# Altium schematic symbol library FPGA_Xilinx_Virtex7.SchLib: 34 symbols (part 6 of 34) (continued)
## XC7VH580T-FLG1931 (continued)
part P pins: A8 MGTZAGND_300 (power), A11 MGTZAGND_300 (power), A14 MGTZAGND_300 (power), A15 MGTZAGND_300 (power), A18 MGTZAGND_300 (power), A21 MGTZAGND_300 (power), A22 MGTZAGND_300 (power), A23 MGTZAGND_300 (power), A26 MGTZAGND_300 (power), A29 MGTZAGND_300 (power), A30 MGTZAGND_300 (power), A33 MGTZAGND_300 (power), A36 MGTZAGND_300 (power), A37 MGTZAGND_300 (power), B8 MGTZAGND_300 (power), B9 MGTZAVCC_300 (power), B10 MGTZAGND_300 (power), B11 MGTZAVCC_300 (power), B12 MGTZAGND_300 (power), B13 MGTZAVCC_300 (power), B14 MGTZAGND_300 (power), B15 MGTZAVCC_300 (power), B16 MGTZAGND_300 (power), B17 MGTZAVCC_300 (power), B18 MGTZAGND_300 (power), B19 MGTZAVCC_300 (power), B20 MGTZAGND_300 (power), B21 MGTZAVCC_300 (power), B22 MGTZAGND_300 (power), B23 MGTZAVCC_300 (power), B24 MGTZAGND_300 (power), B25 MGTZAVCC_300 (power), B26 MGTZAGND_300 (power), B27 MGTZAVCC_300 (power), B28 MGTZAGND_300 (power), B29 MGTZAVCC_300 (power), B30 MGTZAGND_300 (power), B31 MGTZAVCC_300 (power), B32 MGTZAGND_300 (power), B33 MGTZAVCC_300 (power), B34 MGTZAGND_300 (power), B35 MGTZAVCC_300 (power), B36 MGTZAGND_300 (power), B37 MGTZAVCC_300 (power), C8 MGTZAGND_300 (power), C9 MGTZAGND_300 (power), C12 MGTZAGND_300 (power), C15 MGTZAGND_300 (power), C16 MGTZAGND_300 (power), C19 MGTZAGND_300 (power), C22 MGTZAGND_300 (power), C23 MGTZAGND_300 (power), C24 MGTZAGND_300 (power), C27 MGTZAGND_300 (power), C30 MGTZAGND_300 (power), C31 MGTZAGND_300 (power), C34 MGTZAGND_300 (power), C37 MGTZAGND_300 (power), D8 MGTZAGND_300 (power), D9 MGTZAGND_300 (power), D10 MGTZAGND_300 (power), D11 MGTZAGND_300 (power), D12 MGTZAGND_300 (power), D13 MGTZAGND_300 (power), D14 MGTZAGND_300 (power), D15 MGTZAGND_300 (power), D16 MGTZAGND_300 (power), D17 MGTZAGND_300 (power), D18 MGTZAGND_300 (power), D19 MGTZAGND_300 (power), D20 MGTZAGND_300 (power), D21 MGTZAGND_300 (power), D22 MGTZAGND_300 (power), D23 MGTZAGND_300 (power), D24 MGTZAGND_300 (power), D25 MGTZAGND_300 (power), D26 MGTZAGND_300 (power), D27 MGTZAGND_300 (power), D28 MGTZAGND_300 (power), D29 MGTZAGND_300 (power), D30 MGTZAGND_300 (power), D31 MGTZAGND_300 (power), D32 MGTZAGND_300 (power), D33 MGTZAGND_300 (power), D34 MGTZAGND_300 (power), D35 MGTZAGND_300 (power), D36 MGTZAGND_300 (power), D37 MGTZAGND_300 (power), E18 MGTZ_SENSE_AVCC_300 (power), F18 MGTZ_SENSE_AGND_300 (power), F20 MGTZVCCH_300 (power), F22 MGTZVCCH_300 (power), F24 MGTZVCCH_300 (power), F26 MGTZVCCH_300 (power), G18 MGTZVCCH_300 (power), G26 MGTZ_SENSE_GND_300 (power), G27 MGTZ_SENSE_VCCH_300 (power), H26 MGTZ_SENSE_VCC_300 (power), J19 MGTZVCCH_300 (power), J21 MGTZVCCH_300 (power), J23 MGTZVCCH_300 (power), J25 MGTZVCCH_300 (power), J27 MGTZVCCH_300 (power), K19 MGTZ_SENSE_VCCL_300 (power), K20 MGTZ_SENSE_GNDL_300 (power), L20 MGTZVCCL_300 (power), L22 MGTZVCCL_300 (power), L24 MGTZVCCL_300 (power), L26 MGTZVCCL_300 (power)
part Q pins: AB22 VREFN_0 (io), AB23 VP_0 (io), AC22 VN_0 (io), AC23 VREFP_0 (io), AD22 DXN_0 (io), AD23 DXP_0 (io), L18 TCK_0 (io), M17 INIT_B_0 (io), M19 CCLK_0 (io), M21 TDI_0 (io), M23 M2_0 (io), M25 M0_0 (io), N26 TDO_0 (io), P23 PROGRAM_B_0 (io), P27 TMS_0 (io), T19 M1_0 (io), T27 DONE_0 (io), V17 VCCO_0 (power), W16 VCCO_0 (power)
part R pins: A3 GND (power), A4 GND (power), A7 GND (power), A38 GND (power), A41 GND (power), A42 GND (power), AA15 VCCINT (power), AA17 VCCINT (power), AA19 VCCAUX_IO_G3 (power), AA21 VCCINT (power), AA22 GNDADC (power), AA23 VCCADC (power), AA25 VCCAUX_IO_G1 (power), AA27 VCCINT (power), AA29 VCCINT (power), AA31 VCCINT (power), AB16 VCCINT (power), AB18 VCCAUX (power), AB20 VCCINT (power), AB24 VCCBRAM (power), AB26 VCCAUX (power), AB28 VCCINT (power), AB30 VCCINT (power), AC15 VCCINT (power), AC17 VCCINT (power), AC19 VCCAUX_IO_G3 (power), AC21 VCCINT (power), AC25 VCCAUX_IO_G1 (power), AC27 VCCINT (power), AC29 VCCINT (power), AD14 VCCINT (power), AD16 VCCINT (power), AD18 VCCAUX (power), AD20 VCCINT (power), AD24 VCCBRAM (power), AD26 VCCAUX (power), AD28 VCCINT (power), AD30 VCCINT (power), AE15 VCCINT (power), AE17 VCCINT (power), AE19 VCCAUX_IO_G2 (power), AE21 VCCINT (power), AE23 VCCINT (power), AE25 VCCAUX_IO_G1 (power), AE27 VCCINT (power), AE29 VCCINT (power), AE31 VCCINT (power), AF14 VCCINT (power), AF16 VCCINT (power), AF18 VCCAUX (power), AF20 VCCINT (power), AF22 VCCINT (power), AF24 VCCBRAM (power), AF26 VCCAUX (power), AF28 VCCINT (power), AF30 VCCINT (power), AG15 VCCINT (power), AG17 VCCINT (power), AG19 VCCAUX_IO_G2 (power), AG21 VCCINT (power), AG23 VCCINT (power), AG25 VCCAUX_IO_G0 (power), AG27 VCCINT (power), AG29 VCCINT (power), AH18 VCCAUX (power), AH20 VCCINT (power), AH22 VCCINT (power), AH24 VCCBRAM (power), AH26 VCCAUX (power), AH28 VCCINT (power), AJ17 VCCINT (power), AJ19 VCCAUX_IO_G2 (power), AJ21 VCCINT (power), AJ23 VCCINT (power), AJ25 VCCAUX_IO_G0 (power), AJ27 VCCINT (power), AJ29 VCCINT (power), AK18 VCCAUX (power), AK20 VCCINT (power), AK22 VCCINT (power), AK24 VCCBRAM (power), AK26 VCCAUX (power), AL19 VCCAUX_IO_G2 (power), AL21 VCCINT (power), AL23 VCCINT (power), AL25 VCCAUX_IO_G0 (power), AM20 VCCINT (power), AM22 VCCINT (power), AM24 VCCBRAM (power), AM26 VCCAUX (power), B2 GND (power), B6 GND (power), B7 GND (power), B38 GND (power), B39 GND (power), B43 GND (power), C4 GND (power), C7 GND (power), C38 GND (power), C41 GND (power), D1 GND (power), D5 GND (power), D6 GND (power), D7 GND (power), D38 GND (power), D39 GND (power), D40 GND (power), D44 GND (power), E3 GND (power), E7 GND (power), E8 GND (power), E9 GND (power), E10 GND (power), E11 GND (power), E12 GND (power), E13 GND (power), E14 GND (power), E15 GND (power), E16 GND (power), E17 GND (power), E19 GND (power), E22 GND (power), E23 GND (power), E26 GND (power), E27 GND (power), E28 GND (power), E29 GND (power), E30 GND (power), E31 GND (power), E32 GND (power), E33 GND (power), E34 GND (power), E35 GND (power), E36 GND (power), E37 GND (power), E38 GND (power), E42 GND (power), F1 GND (power), F5 GND (power), F6 GND (power), F7 GND (power), F17 GND (power), F19 GND (power), F21 GND (power), F23 GND (power), F25 GND (power), F27 GND (power), F28 GND (power), F37 GND (power), F38 GND (power), F39 GND (power), F40 GND (power), F44 GND (power), G3 GND (power), G4 GND (power), G7 GND (power), G14 GND (power), G17 GND (power), G19 GND (power), G22 GND (power), G23 GND (power), G24 GND (power), G25 GND (power), G28 GND (power), G34 GND (power), G38 GND (power), G41 GND (power), G42 GND (power), H1 GND (power), H2 GND (power), H6 GND (power), H7 GND (power), H11 GND (power), H17 GND (power), H18 GND (power), H19 GND (power), H20 GND (power), H21 GND (power), H23 GND (power), H24 GND (power), H25 GND (power), H27 GND (power), H28 GND (power), H31 GND (power), M27 VCCBATT_0 (power), N17 VCCINT (power), N19 VCCINT (power), N21 VCCINT (power), N23 VCCINT (power), N25 VCCINT (power), N27 VCCINT (power), P18 VCCINT (power), P20 VCCINT (power), P22 VCCINT (power), P24 VCCINT (power), P26 VCCINT (power), P28 VCCINT (power), R17 VCCINT (power), R19 VCCINT (power), R21 VCCINT (power), R23 VCCINT (power), R25 VCCINT (power), R27 VCCINT (power), T18 VCCINT (power), T20 VCCINT (power), T22 VCCINT (power), T24 VCCINT (power), T26 VCCINT (power), T28 VCCINT (power), U17 VCCINT (power), U19 VCCINT (power), U21 VCCINT (power), U23 VCCBRAM (power), U25 VCCINT (power), U27 VCCINT (power), V16 VCCINT (power), V18 VCCINT (power), V20 VCCINT (power), V22 VCCINT (power), V24 VCCBRAM (power), V26 VCCINT (power), V28 VCCINT (power), V30 VCCINT (power), W15 VCCINT (power), W17 VCCINT (power), W19 VCCAUX_IO_G3 (power), W21 VCCINT (power), W23 VCCBRAM (power), W25 VCCINT (power), W27 VCCINT (power), W29 VCCINT (power), W31 VCCINT (power), Y14 VCCINT (power), Y16 VCCINT (power), Y18 VCCAUX (power), Y20 VCCINT (power), Y22 VCCINT (power), Y24 VCCBRAM (power), Y26 VCCINT (power), Y28 VCCINT (power), Y30 VCCINT (power)
part S pins: AA4 GND (power), AA7 GND (power), AA12 GND (power), AA14 GND (power), AA16 GND (power), AA18 GND (power), AA20 GND (power), AA24 GND (power), AA26 GND (power), AA28 GND (power), AA30 GND (power), AA32 GND (power), AA38 GND (power), AA41 GND (power), AB1 GND (power), AB5 GND (power), AB7 GND (power), AB9 GND (power), AB15 GND (power), AB17 GND (power), AB19 GND (power), AB21 GND (power), AB25 GND (power), AB27 GND (power), AB29 GND (power), AB31 GND (power), AB38 GND (power), AB40 GND (power), AB44 GND (power), AC3 GND (power), AC7 GND (power), AC14 GND (power), AC16 GND (power), AC18 GND (power), AC20 GND (power), AC24 GND (power), AC26 GND (power), AC28 GND (power), AC30 GND (power), AC36 GND (power), AC38 GND (power), AC42 GND (power), AD1 GND (power), AD5 GND (power), AD7 GND (power), AD13 GND (power), AD15 GND (power), AD17 GND (power), AD19 GND (power), AD21 GND (power), AD25 GND (power), AD27 GND (power), AD29 GND (power), AD31 GND (power), AD33 GND (power), AD38 GND (power), AD40 GND (power), AD44 GND (power), AE3 GND (power), AE4 GND (power), AE7 GND (power), AE10 GND (power), AE14 GND (power), AE16 GND (power), AE18 GND (power), AE20 GND (power), AE22 GND (power), AE24 GND (power), AE26 GND (power), AE28 GND (power), AE30 GND (power), AE38 GND (power), AE41 GND (power), AE42 GND (power), AF1 GND (power), AF6 GND (power), AF7 GND (power), AF15 GND (power), AF17 GND (power), AF19 GND (power), AF21 GND (power), AF23 GND (power), AF25 GND (power), AF27 GND (power), AF29 GND (power), AF31 GND (power), AF37 GND (power), AF38 GND (power), AF39 GND (power), AF44 GND (power), AG4 GND (power), AG7 GND (power), AG14 GND (power), AG16 GND (power), AG18 GND (power), AG20 GND (power), AG22 GND (power), AG24 GND (power), AG26 GND (power), AG28 GND (power), AG30 GND (power), AG34 GND (power), AG38 GND (power), AG41 GND (power), AH1 GND (power), AH2 GND (power), AH5 GND (power), AH6 GND (power), AH7 GND (power), AH11 GND (power), AH17 GND (power), AH19 GND (power), AH21 GND (power), AH23 GND (power), AH25 GND (power), AH27 GND (power), AH29 GND (power), AH31 GND (power), H38 GND (power), H39 GND (power), H43 GND (power), H44 GND (power), J3 GND (power), J4 GND (power), J7 GND (power), J8 GND (power), J17 GND (power), J18 GND (power), J20 GND (power), J24 GND (power), J26 GND (power), J28 GND (power), J38 GND (power), J41 GND (power), J42 GND (power), K1 GND (power), K5 GND (power), K6 GND (power), K7 GND (power), K15 GND (power), K17 GND (power), K18 GND (power), K21 GND (power), K22 GND (power), K23 GND (power), K24 GND (power), K25 GND (power), K26 GND (power), K27 GND (power), K28 GND (power), K35 GND (power), K38 GND (power), K39 GND (power), K40 GND (power), K44 GND (power), L3 GND (power), L7 GND (power), L12 GND (power), L17 GND (power), L19 GND (power), L21 GND (power), L23 GND (power), L25 GND (power), L27 GND (power), L28 GND (power), L32 GND (power), L38 GND (power), L42 GND (power), M1 GND (power), M2 GND (power), M5 GND (power), M6 GND (power), M7 GND (power), M9 GND (power), M18 GND (power), M20 GND (power), M22 GND (power), M24 GND (power), M26 GND (power), M28 GND (power), M29 GND (power), M38 GND (power), M39 GND (power), M40 GND (power), M43 GND (power), M44 GND (power), N3 GND (power), N4 GND (power), N7 GND (power), N16 GND (power), N18 GND (power), N20 GND (power), N22 GND (power), N24 GND (power), N28 GND (power), N36 GND (power), N38 GND (power), N41 GND (power), N42 GND (power), P1 GND (power), P6 GND (power), P7 GND (power), P13 GND (power), P17 GND (power), P19 GND (power), P21 GND (power), P25 GND (power), P33 GND (power), P38 GND (power), P39 GND (power), P44 GND (power), R3 GND (power), R4 GND (power), R7 GND (power), R10 GND (power), R18 GND (power), R20 GND (power), R22 GND (power), R24 GND (power), R26 GND (power), R28 GND (power), R30 GND (power), R38 GND (power), R41 GND (power), R42 GND (power), T1 GND (power), T2 GND (power), T5 GND (power), T6 GND (power), T7 GND (power), T17 GND (power), T21 GND (power), T23 GND (power), T25 GND (power), T37 GND (power), T38 GND (power), T39 GND (power), T40 GND (power), T43 GND (power), T44 GND (power), U3 GND (power), U7 GND (power), U14 GND (power), U16 GND (power), U18 GND (power), U20 GND (power), U22 GND (power), U24 GND (power), U26 GND (power), U28 GND (power), U34 GND (power), U38 GND (power), U42 GND (power), V1 GND (power), V5 GND (power), V6 GND (power), V7 GND (power), V11 GND (power), V15 GND (power), V19 GND (power), V21 GND (power), V23 GND (power), V25 GND (power), V27 GND (power), V29 GND (power), V31 GND (power), V38 GND (power), V39 GND (power), V40 GND (power), V44 GND (power), W3 GND (power), W4 GND (power), W7 GND (power), W8 GND (power), W18 GND (power), W20 GND (power), W22 GND (power), W24 GND (power), W26 GND (power), W28 GND (power), W30 GND (power), W38 GND (power), W41 GND (power), W42 GND (power), Y1 GND (power), Y2 GND (power), Y6 GND (power), Y7 GND (power), Y15 GND (power), Y17 GND (power), Y19 GND (power), Y21 GND (power), Y23 GND (power), Y25 GND (power), Y27 GND (power), Y29 GND (power), Y31 GND (power), Y35 GND (power), Y38 GND (power), Y39 GND (power), Y43 GND (power), Y44 GND (power)
part T pins: AH38 GND (power), AH39 GND (power), AH40 GND (power), AH43 GND (power), AH44 GND (power), AJ3 GND (power), AJ7 GND (power), AJ8 GND (power), AJ18 GND (power), AJ20 GND (power), AJ22 GND (power), AJ24 GND (power), AJ26 GND (power), AJ28 GND (power), AJ38 GND (power), AJ42 GND (power), AK1 GND (power), AK5 GND (power), AK6 GND (power), AK7 GND (power), AK15 GND (power), AK19 GND (power), AK21 GND (power), AK23 GND (power), AK25 GND (power), AK35 GND (power), AK38 GND (power), AK39 GND (power), AK40 GND (power), AK44 GND (power), AL3 GND (power), AL4 GND (power), AL7 GND (power), AL12 GND (power), AL20 GND (power), AL22 GND (power), AL24 GND (power), AL26 GND (power), AL32 GND (power), AL38 GND (power), AL41 GND (power), AL42 GND (power), AM1 GND (power), AM2 GND (power), AM6 GND (power), AM7 GND (power), AM9 GND (power), AM19 GND (power), AM21 GND (power), AM23 GND (power), AM25 GND (power), AM29 GND (power), AM38 GND (power), AM39 GND (power), AM43 GND (power), AM44 GND (power), AN3 GND (power), AN4 GND (power), AN7 GND (power), AN16 GND (power), AN26 GND (power), AN36 GND (power), AN38 GND (power), AN41 GND (power), AN42 GND (power), AP1 GND (power), AP5 GND (power), AP6 GND (power), AP7 GND (power), AP13 GND (power), AP23 GND (power), AP33 GND (power), AP38 GND (power), AP39 GND (power), AP40 GND (power), AP44 GND (power), AR3 GND (power), AR7 GND (power), AR10 GND (power), AR20 GND (power), AR30 GND (power), AR38 GND (power), AR42 GND (power), AT1 GND (power), AT2 GND (power), AT5 GND (power), AT6 GND (power), AT7 GND (power), AT17 GND (power), AT27 GND (power), AT37 GND (power), AT38 GND (power), AT39 GND (power), AT40 GND (power), AT43 GND (power), AT44 GND (power), AU3 GND (power), AU4 GND (power), AU7 GND (power), AU14 GND (power), AU24 GND (power), AU34 GND (power), AU38 GND (power), AU41 GND (power), AU42 GND (power), AV1 GND (power), AV6 GND (power), AV7 GND (power), AV11 GND (power), AV21 GND (power), AV31 GND (power), AV38 GND (power), AV39 GND (power), AV44 GND (power), AW3 GND (power), AW4 GND (power), AW7 GND (power), AW8 GND (power), AW18 GND (power), AW28 GND (power), AW38 GND (power), AW41 GND (power), AW42 GND (power), AY1 GND (power), AY2 GND (power), AY5 GND (power), AY6 GND (power), AY7 GND (power), AY15 GND (power), AY25 GND (power), AY35 GND (power), AY38 GND (power), AY39 GND (power), AY40 GND (power), AY43 GND (power), AY44 GND (power), BA3 GND (power), BA5 GND (power), BA12 GND (power), BA22 GND (power), BA32 GND (power), BA40 GND (power), BA42 GND (power), BB1 GND (power), BB5 GND (power), BB9 GND (power), BB19 GND (power), BB29 GND (power), BB39 GND (power), BB40 GND (power), BB44 GND (power), BC2 GND (power), BC4 GND (power), BC5 GND (power), BC6 GND (power), BC16 GND (power), BC26 GND (power), BC36 GND (power), BC40 GND (power), BC41 GND (power), BC43 GND (power), BD5 GND (power), BD13 GND (power), BD23 GND (power), BD33 GND (power), BD40 GND (power)

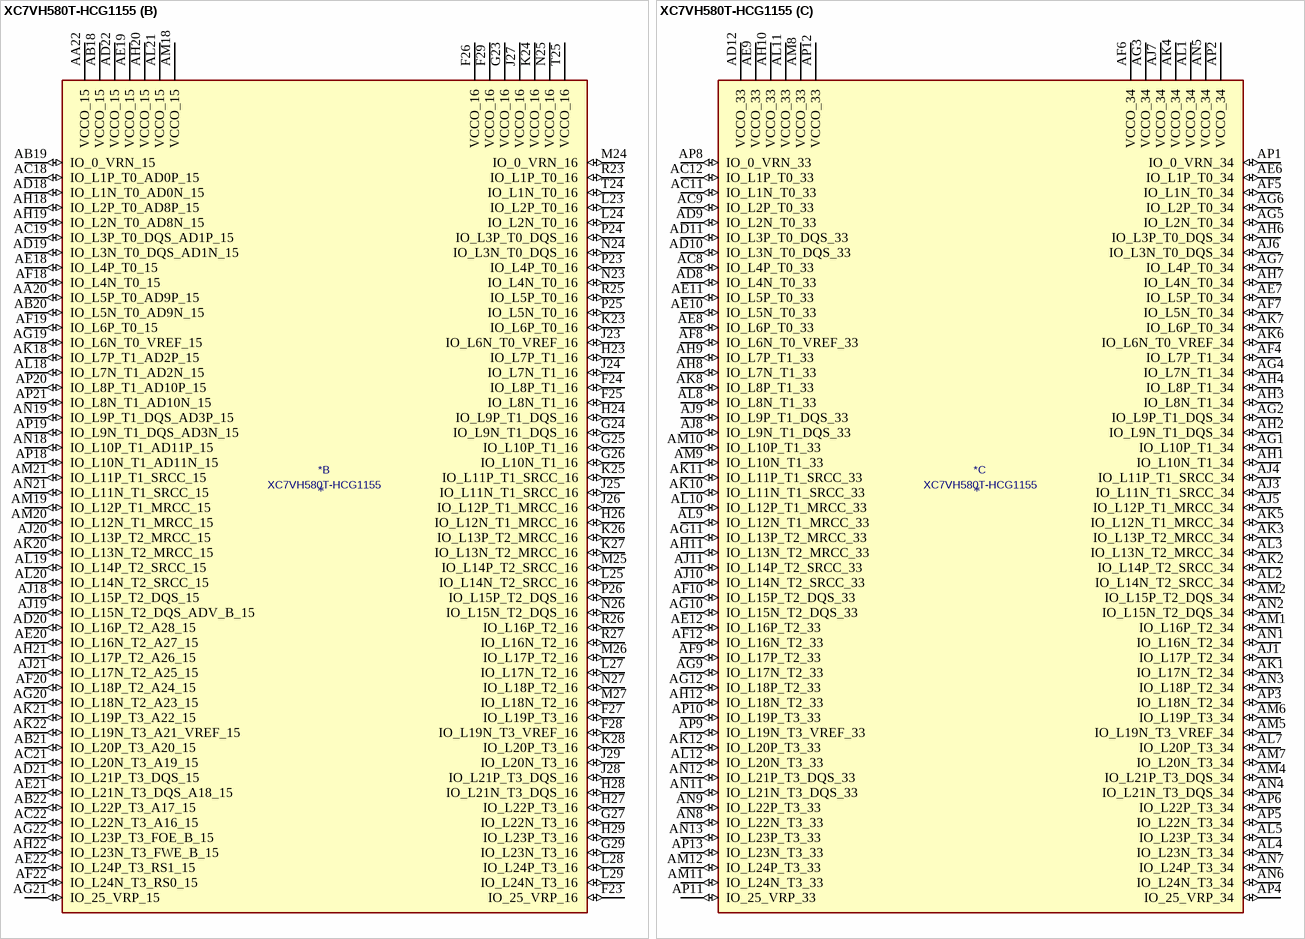
[diagram p33: symbol XC7VH580T-HCG1155]

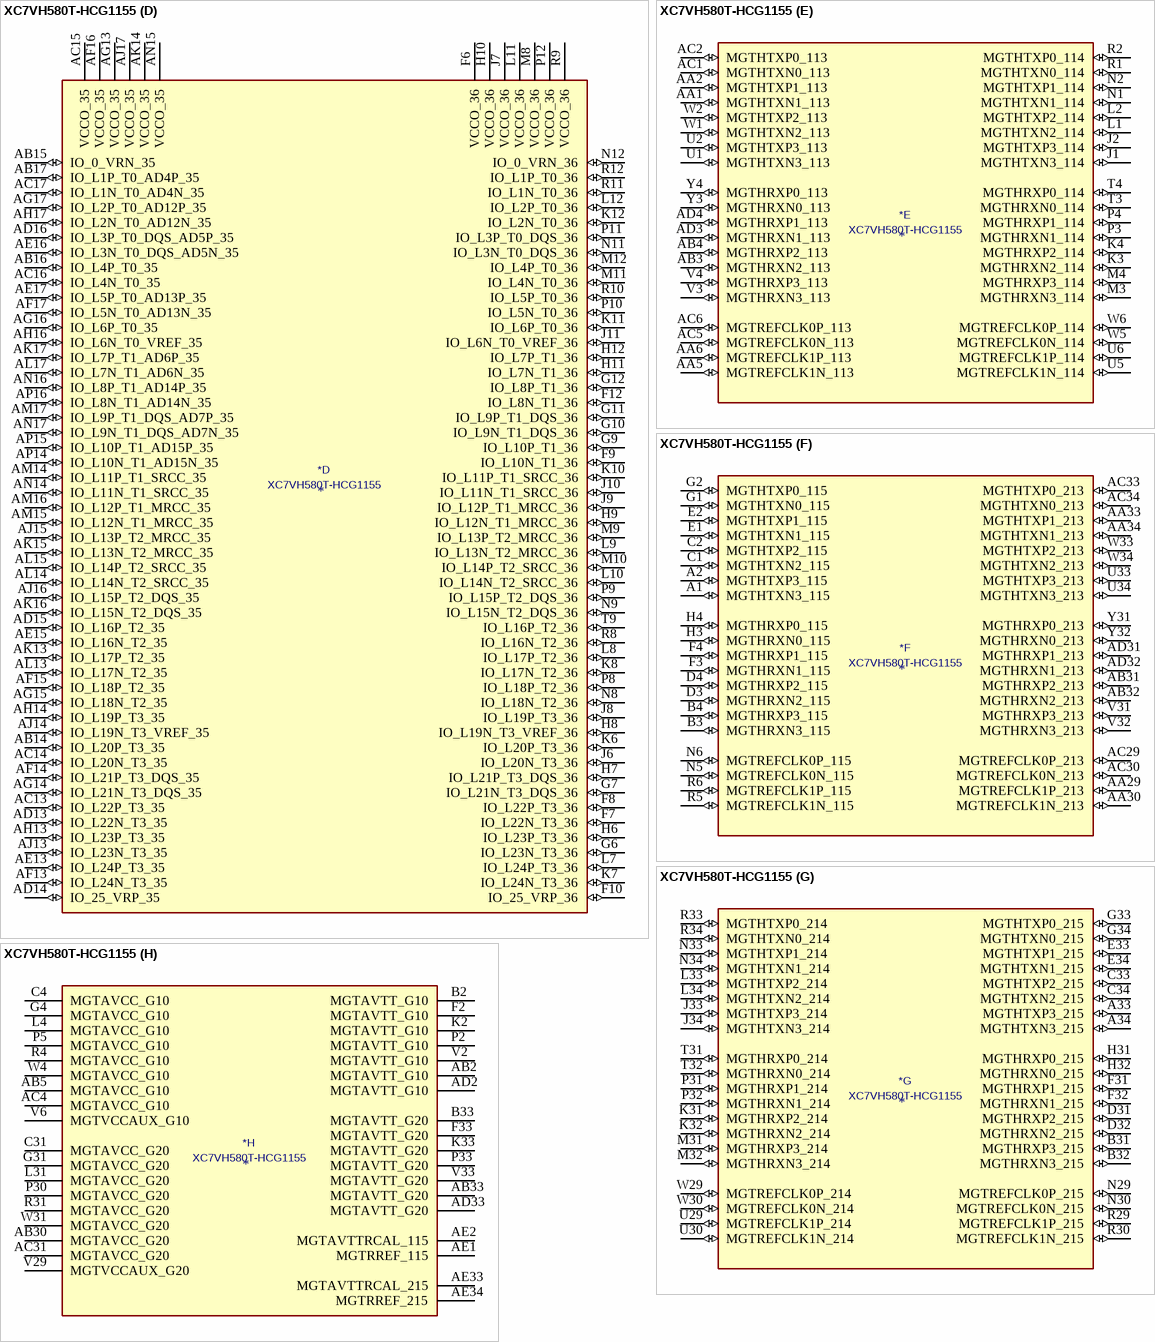
[diagram p34: symbol XC7VH580T-HCG1155]

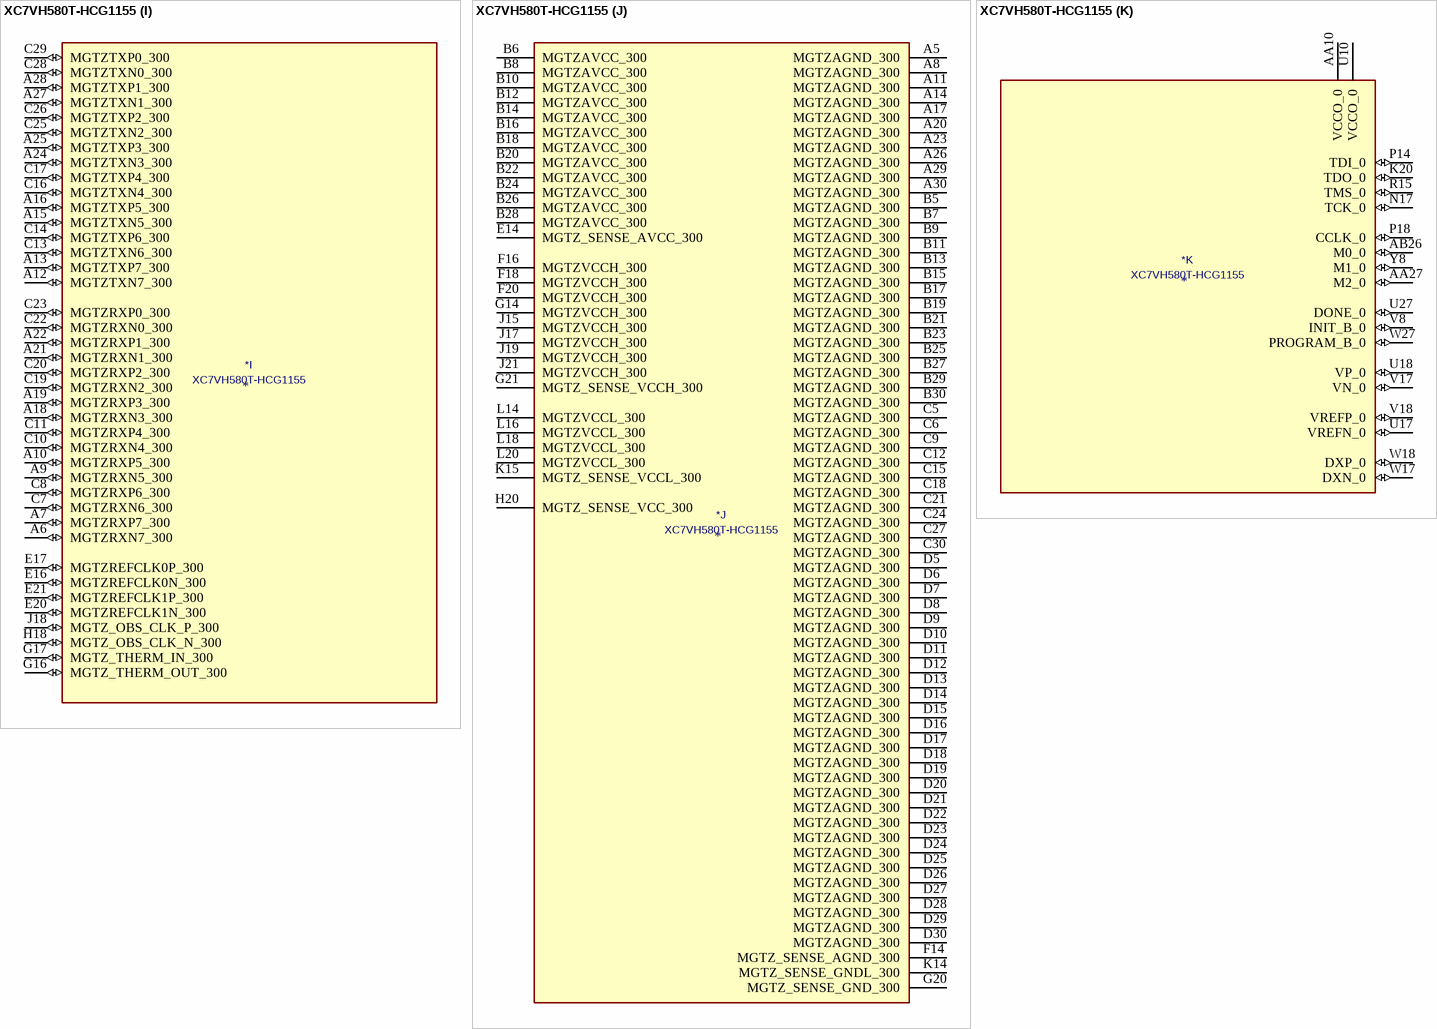
[diagram p35: symbol XC7VH580T-HCG1155]

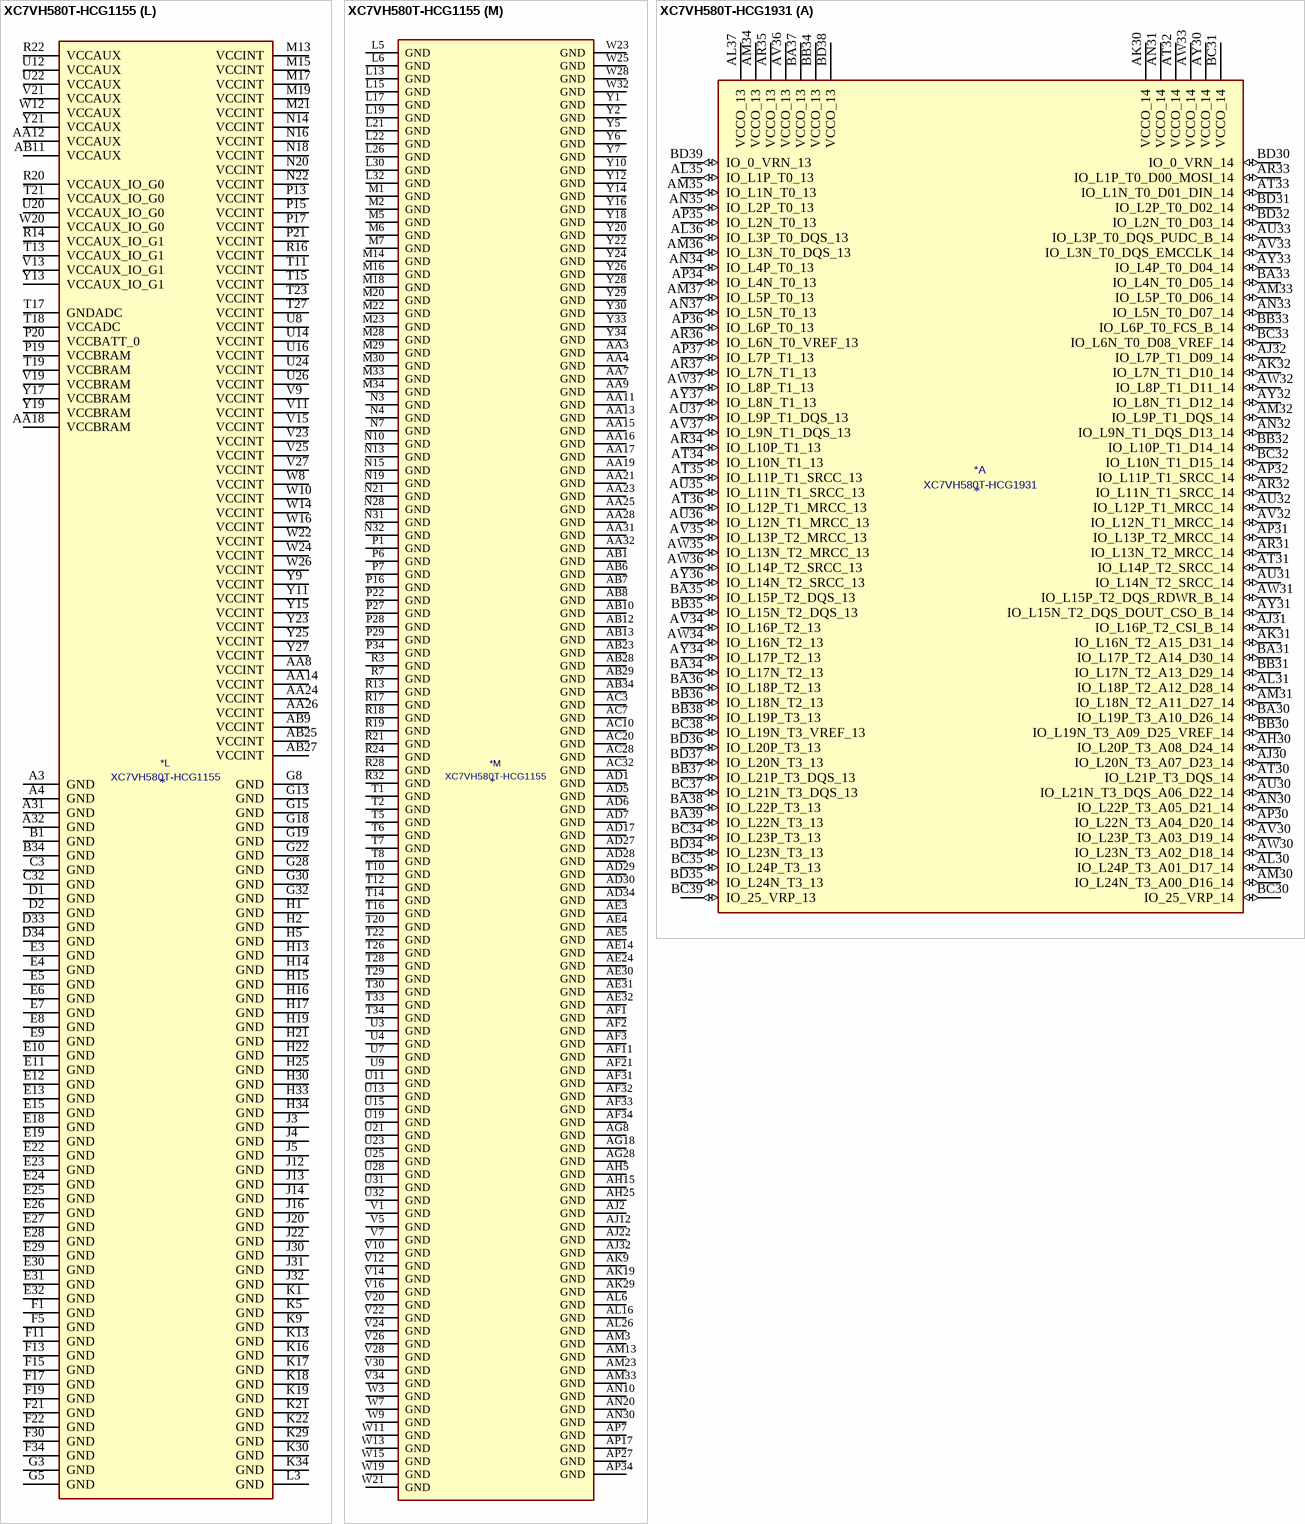
[diagram p36: symbols XC7VH580T-HCG1155 to XC7VH580T-HCG1931]